# Altium schematic symbol library CUSTOM SCH - Copy.SchLib: 494 symbols (part 4 of 6) (continued)
## SMARC_2.0_CARRIER (continued)

## SMF15CT1G
designator D?
Manufacturer: ON Semiconductor; Manufacturer Part Number: SMF15CT1G; Number of Elements: 5; Capacitance: 33pF; Operating Supply Voltage: 15V; Max Surge Current: 5A; Reverse Breakdown Voltage: 17V; Direction: Unidirectional; Clamping Voltage: 29V; Peak Pulse Power: 100W; Power Line Protection: No; Max Breakdown Voltage: 19V; Leakage Current: 1uA; Element Configuration: Common Anode; ESD Protection: Yes; Test Current: 1mA; Supplier 1: Digi-Key; Stock 1: 2972; Pricing 1: 1=0.36, 10=0.289, 100=0.1971, 500=0.1478, 1000=0.1109 (USD); Case/Package: SC; Number of Pins: 6; Min Operating Temperature: -40°C; Max Operating Temperature: 125°C; Package Quantity: 1; Packaging: Tape and Reel; Number of Unidirectional Channels: 5; Reverse Standoff Voltage: 15V; Min Breakdown Voltage: 17V; Polarity: Unidirectional; Number of Channels: 5; Breakdown Voltage: 17V; Termination: SMD/SMT; Working Voltage: 15V; Power Dissipation: 100W; Max Reverse Leakage Current: 1uA; Peak Pulse Current: 5A; Voltage Rating (DC): 15V; Composition: Zener; Length: 2mm; Height: 1mm; Depth: 1.25mm; Width: 1.35mm; Radiation Hardening: No; Lead Free: Lead Free; ComponentLink1URL: http://www.onsemi.com/pub/Collateral/SMF05C-D.PDF?src-supplier=Digi-Key; ComponentLink1Description: http://www.onsemi.com/pub/Collateral/SMF05C-D.PDF?src-supplier=Digi-Key; ComponentLink2URL: http://www.onsemi.com/pub/Collateral/SMF05C-D.PDF?src-supplier=Avnet; ComponentLink2Description: http://www.onsemi.com/pub/Collateral/SMF05C-D.PDF?src-supplier=Avnet; ComponentLink3URL: http://www.onsemi.com/pub_link/Collateral/SMF05C-D.PDF?src-supplier=Future+Electronics; ComponentLink3Description: http://www.onsemi.com/pub_link/Collateral/SMF05C-D.PDF?src-supplier=Future+Electronics; Supplier Part Number 1: SMF15CT1GOSCT-ND
footprint SOT363-6
pins: 1 Cathode, 2 Anode, 3 Cathode, 4 Cathode, 5 Cathode, 6 Cathode

## SN74AHC14PWR
designator U?, comment Manufacturer Part Number: SN74AHC14PWR  (hidden comment: Part Number: SN74AHC14PWR)
IC INVERTER SCHMITT 6CH 14TSSOP; Manufacturer: Texas Instruments; Number of Inputs: 6; Propagation Delay: 10.6ns; Output Current: 25mA; Min Supply Voltage: 2V; Max Supply Voltage: 5.5V; Logic Function: Buffer,Inverter,Schmitt Trigger; Quiescent Current: 2uA; High Level Output Current: -8mA; Low Level Output Current: 8mA; Turn-On Delay Time: 12ns; Schmitt Trigger Input: Yes; Operating Supply Voltage: 5V; Supplier 1: Digi-Key; Stock 1: 20969; Pricing 1: 1=0.48, 10=0.364, 100=0.227, 500=0.1553, 1000=0.1195 (USD); Mount: Surface Mount; Case/Package: 14-TSSOP; Number of Pins: 14; Weight: 0.002018oz; Contact Plating: Tin,Matte; Min Operating Temperature: -40°C; Max Operating Temperature: 125°C; Package Quantity: 1; Packaging: Tape and Reel; Number of Elements: 6; Number of Circuits: 6; Number of Gates: 6; Number of Bits: 6; Length: 5mm; Height: 1.15mm; Width: 4.4mm; Radiation Hardening: No; REACH SVHC: No SVHC; Lead Free: Lead Free; ComponentLink1URL: http://www.ti.com/lit/ds/symlink/sn74ahc14.pdf?src-supplier=Digi-Key; ComponentLink1Description: http://www.ti.com/lit/ds/symlink/sn74ahc14.pdf?src-supplier=Digi-Key; ComponentLink2URL: http://www.farnell.com/datasheets/1962896.pdf?src-supplier=Element14; ComponentLink2Description: http://www.farnell.com/datasheets/1962896.pdf?src-supplier=Element14; ComponentLink3URL: http://www.ti.com/lit/gpn/sn74ahc14?src-supplier=Mouser; ComponentLink3Description: http://www.ti.com/lit/gpn/sn74ahc14?src-supplier=Mouser; ComponentLink4URL: http://www.ti.com/general/docs/lit/getliterature.tsp?genericPartNumber=SN54AHC14&&fileType=pdf&src-supplier=Avnet; ComponentLink4Description: http://www.ti.com/general/docs/lit/getliterature.tsp?genericPartNumber=SN54AHC14&&fileType=pdf&src-supplier=Avnet; ComponentLink5URL: http://focus.ti.com/lit/ds/symlink/sn74ahc14.pdf?src-supplier=Avnet; ComponentLink5Description: http://focus.ti.com/lit/ds/symlink/sn74ahc14.pdf?src-supplier=Avnet; ComponentLink6URL: http://www.farnell.com/datasheets/1633735.pdf?src-supplier=Element14; ComponentLink6Description: http://www.farnell.com/datasheets/1633735.pdf?src-supplier=Element14; ComponentLink7URL: https://www.verical.com/server-webapp/html/getDatasheet?partID=248985&src-supplier=Verical; ComponentLink7Description: https://www.verical.com/server-webapp/html/getDatasheet?partID=248985&src-supplier=Verical; ComponentLink8URL: http://www.ti.com/lit/ds/symlink/sn54ahc14.pdf?src-supplier=Avnet+Europe; ComponentLink8Description: http://www.ti.com/lit/ds/symlink/sn54ahc14.pdf?src-supplier=Avnet+Europe; ComponentLink9URL: http://www.jameco.com/Jameco/Products/ProdDS/1383795.pdf?src-supplier=Jameco; ComponentLink9Description: http://www.jameco.com/Jameco/Products/ProdDS/1383795.pdf?src-supplier=Jameco; ComponentLink10URL: http://www.produktinfo.conrad.com/datenblaetter/1000000-1099999/001016189-da-01-en-IC_HEX_SCHM_TR_SN74AHC14PWR_TSSOP_14_TID.pdf?src-supplier=Conrad; ComponentLink10Description: http://www.produktinfo.conrad.com/datenblaetter/1000000-1099999/001016189-da-01-en-IC_HEX_SCHM_TR_SN74AHC14PWR_TSSOP_14_TID.pdf?src-supplier=Conrad; Supplier Part Number 1: 296-1086-1-ND
footprint 14-TSSOP
pins: 1 1A, 2 1Y, 3 2A, 4 2Y, 7 GND (power), 14 VCC (power)

## SN74AUP1G34DRYR
designator U?
Manufacturer Part Number: SN74AUP1G34DRYR; Case/Package: USON-6L
footprint PSON50P145X100X60-6N
pins: 1 N.C. (io), 2 A (in), 3 GND (power), 4 Y (out), 5 N.C. (io), 6 VCC (power)

## SN74AUP1T34DCKR
designator U?
1-Bit Unidirectional Voltage-Level Translator 5-SC70 -40 to 85; Manufacturer Part Number: SN74AUP1T34DCKR; Case/Package: SOT23 5N
footprint SOT65P210X110-5N (SN74AUP1G34)
pins: 1 VCCA (power), 2 A (in), 3 GND (power), 4 B (out), 5 VCCB (power)

## SN74LVC1G80DCKR
designator U?
IC FF D-TYPE SNGL 1BIT SC70-5; Manufacturer: Texas Instruments; Clock Edge Trigger Type: Positive Edge; Max Supply Voltage: 5.5V; Min Supply Voltage: 1.65V; Propagation Delay: 5.2ns; Frequency: 160MHz; Output Current: 32mA; Logic Function: D-Type,Flip-Flop; Number of Elements: 1; Turn-On Delay Time: 1.1ns; High Level Output Current: -32mA; Polarity: Inverting; Supplier 1: Digi-Key; Stock 1: 59765; Pricing 1: 1=0.36, 10=0.29, 100=0.1978, 500=0.1483, 1000=0.1112 (USD); Mount: Surface Mount; Case/Package: SC70-5; Number of Pins: 5; Weight: 8.8E-05oz; Min Operating Temperature: -40°C; Max Operating Temperature: 125°C; Packaging: Tape and Reel; Package Quantity: 3000; Number of Bits per Element: 1; Low Level Output Current: 32mA; Number of Circuits: 1; Number of Input Lines: 1; Number of Output Lines: 1; Number of Bits: 1; Max Frequency: 160MHz; Termination: SMD/SMT; Number of Gates: 1; Length: 2mm; Height: 0.9mm; Width: 1.25mm; Radiation Hardening: No; REACH SVHC: No SVHC; Lead Free: Lead Free; ComponentLink1URL: http://focus.ti.com/lit/ds/symlink/sn74lvc1g80.pdf?src-supplier=Avnet+Europe; ComponentLink1Description: http://focus.ti.com/lit/ds/symlink/sn74lvc1g80.pdf?src-supplier=Avnet+Europe; ComponentLink2URL: https://www.verical.com/server-webapp/html/getDatasheet?partID=189864&src-supplier=Verical; ComponentLink2Description: https://www.verical.com/server-webapp/html/getDatasheet?partID=189864&src-supplier=Verical; ComponentLink3URL: http://www.ti.com/lit/ds/symlink/sn74lvc1g80.pdf?src-supplier=Digi-Key; ComponentLink3Description: http://www.ti.com/lit/ds/symlink/sn74lvc1g80.pdf?src-supplier=Digi-Key; ComponentLink4URL: http://www.ti.com/general/docs/lit/getliterature.tsp?genericPartNumber=SN74LVC1G80&&fileType=pdf&src-supplier=Avnet; ComponentLink4Description: http://www.ti.com/general/docs/lit/getliterature.tsp?genericPartNumber=SN74LVC1G80&&fileType=pdf&src-supplier=Avnet; ComponentLink5URL: http://www.farnell.com/datasheets/1831218.pdf?src-supplier=Element14; ComponentLink5Description: http://www.farnell.com/datasheets/1831218.pdf?src-supplier=Element14; ComponentLink6URL: http://www.farnell.com/datasheets/1882705.pdf?src-supplier=Element14; ComponentLink6Description: http://www.farnell.com/datasheets/1882705.pdf?src-supplier=Element14; Supplier Part Number 1: 296-9852-6-ND; Manufacturer Part Number: SN74LVC1G80DCKR
footprint SC70-5
pins: 1 D (in), 2 CLK (in), 3 GND (power), 4 Q (out), 5 VCC (power)

## SN74LVC2G74DCUR
designator U?  Manufacturer Part Number: SN74LVC2G74DCUR
IC FF D-TYPE SNGL 1BIT US8; Manufacturer: Texas Instruments; Clock Edge Trigger Type: Positive Edge; Max Supply Voltage: 5.5V; Min Supply Voltage: 1.65V; Propagation Delay: 14.4ns; Frequency: 200MHz; Output Current: 32mA; Number of Elements: 1; Logic Function: AND,D-Type; Turn-On Delay Time: 4.1ns; High Level Output Current: -32mA; Polarity: Non-Inverting; Number of Gates: 2; Quiescent Current: 10uA; Supplier 1: Digi-Key; Stock 1: 34576; Pricing 1: 1=0.55, 10=0.467, 100=0.349, 500=0.2742, 1000=0.2119 (USD); Mount: Surface Mount; Case/Package: VSSOP; Number of Pins: 8; Weight: 0.000339oz; Contact Plating: Gold; Min Operating Temperature: -40°C; Max Operating Temperature: 125°C; Packaging: Tape and Reel; Package Quantity: 3000; Number of Bits per Element: 1; Low Level Output Current: 32mA; Number of Circuits: 1; Number of Input Lines: 1; Number of Output Lines: 1; Number of Bits: 1; Max Frequency: 200MHz; Termination: SMD/SMT; Number of Channels: 1; Length: 2.3mm; Height: 0.85mm; Width: 2mm; Radiation Hardening: No; REACH SVHC: No SVHC; Lead Free: Lead Free; ComponentLink1URL: https://www.verical.com/server-webapp/html/getDatasheet?partID=189863&src-supplier=Verical; ComponentLink1Description: https://www.verical.com/server-webapp/html/getDatasheet?partID=189863&src-supplier=Verical; ComponentLink2URL: http://www.ti.com/lit/ds/symlink/sn74lvc2g74.pdf?src-supplier=Digi-Key; ComponentLink2Description: http://www.ti.com/lit/ds/symlink/sn74lvc2g74.pdf?src-supplier=Digi-Key; ComponentLink3URL: http://www.farnell.com/datasheets/1849776.pdf?src-supplier=Element14; ComponentLink3Description: http://www.farnell.com/datasheets/1849776.pdf?src-supplier=Element14; ComponentLink4URL: http://focus.ti.com/lit/ds/symlink/sn74lvc2g74.pdf?src-supplier=Avnet+Europe; ComponentLink4Description: http://focus.ti.com/lit/ds/symlink/sn74lvc2g74.pdf?src-supplier=Avnet+Europe; ComponentLink5URL: http://www.ti.com/general/docs/lit/getliterature.tsp?genericPartNumber=SN74LVC2G74&amp;&amp;fileType=pdf&src-supplier=Avnet+Asia; ComponentLink5Description: http://www.ti.com/general/docs/lit/getliterature.tsp?genericPartNumber=SN74LVC2G74&amp;&amp;fileType=pdf&src-supplier=Avnet+Asia; ComponentLink6URL: http://www.jameco.com/Jameco/Products/ProdDS/757249.pdf?src-supplier=Jameco; ComponentLink6Description: http://www.jameco.com/Jameco/Products/ProdDS/757249.pdf?src-supplier=Jameco; ComponentLink7URL: http://www.ti.com/general/docs/lit/getliterature.tsp?genericPartNumber=SN74LVC2G74&&fileType=pdf&src-supplier=Avnet; ComponentLink7Description: http://www.ti.com/general/docs/lit/getliterature.tsp?genericPartNumber=SN74LVC2G74&&fileType=pdf&src-supplier=Avnet; ComponentLink8URL: http://www.produktinfo.conrad.com/datenblaetter/1000000-1099999/001074282-da-01-en-IC_D_TYPE_POS_T_SN74LVC2G74DCUR_US_8_TID.pdf?src-supplier=Conrad; ComponentLink8Description: http://www.produktinfo.conrad.com/datenblaetter/1000000-1099999/001074282-da-01-en-IC_D_TYPE_POS_T_SN74LVC2G74DCUR_US_8_TID.pdf?src-supplier=Conrad; ComponentLink9URL: http://datasheet.iiic.cc/texas_instruments/SN74LVC2G74DCUR.pdf?src-supplier=IIIC; ComponentLink9Description: http://datasheet.iiic.cc/texas_instruments/SN74LVC2G74DCUR.pdf?src-supplier=IIIC; Supplier Part Number 1: 296-12755-1-ND
footprint DCU8-M
pins: 1 CLK (in), 2 D (in), 3 Q (out), 4 GND (power), 5 Q (out), 6 CLR (in), 7 PRE (in), 8 VCC (power)

## SP3485EN-L/TR
designator U?  Manufacturer Part Number: SP3485EN-L/TR  Case/Package: 8-SOIC
SP3485 Series 10 Mbps 3.3 V Low Power Half Duplex RS-485 Transceiver - SOIC-8N; Manufacturer: MaxLinear; Data Rate: 10Mbps; Receiver Hysteresis: 20mV; Supplier 1: Digi-Key; RoHS: No; Stock 1: 20475; Pricing 1: 1=2.15000, 10=1.92700, 25=1.81800, 100=1.45440, 250=1.27260, 500=1.23624, 1000=0.98172 (USD); Mount: Surface Mount; Number of Pins: 8; Min Operating Temperature: -40°C; Max Operating Temperature: 85°C; Packaging: Cut Tape; Simplex/Duplex: Half Duplex; ComponentLink1URL: https://www.exar.com/content/document.ashx?id=639&src-supplier=Digi-Key; ComponentLink1Description: https://www.exar.com/content/document.ashx?id=639&src-supplier=Digi-Key; Supplier Part Number 1: 1016-1817-1-ND
footprint 8-SOIC
pins: 1 RO, 2 RE, 3 DE, 4 DI, 5 GND, 6 A, 7 B, 8 VCC
text: .

## SPH0645LM4H-B
designator U?
Manufacturer Part Number: *; Case/Package: *
pins: 1 WS, 2 SEL, 3 GND, 4 BCLK, 5 VDD, 6 DATA

## SPI FLASH (W25Q16JVSNIQ)
designator U?  Manufacturer Part Number: W25Q16JVSNIQ  (hidden comment: *)
FLASH - NOR Memory IC 16Mb (2M x 8) SPI - Quad I/O 133MHz  8-SOIC; Manufacturer: Winbond; Interface: SPI,Serial; Page Size: 256B; Access Time: 6ns; Min Supply Voltage: 2.7V; Max Supply Voltage: 3.6V; Supplier 1: Digi-Key; Stock 1: 64142; Pricing 1: 1=0.49, 10=0.484, 25=0.4492, 50=0.4468, 100=0.397, 250=0.3918, 500=0.3859, 1000=0.3756, 5000=0.3376 (USD); Mount: Surface Mount; Case/Package: 8-SOIC; Number of Pins: 8; Min Operating Temperature: -40°C; Max Operating Temperature: 85°C; Memory Type: NOR; Packaging: Rail/Tube; Memory Size: 16Mb; Frequency: 133MHz; ComponentLink1URL: http://www.winbond.com/resource-files/w25q16jv%20spi%20revg%2003222018%20plus.pdf?src-supplier=Digi-Key; ComponentLink1Description: http://www.winbond.com/resource-files/w25q16jv%20spi%20revg%2003222018%20plus.pdf?src-supplier=Digi-Key; Supplier Part Number 1: W25Q16JVSNIQ-ND
footprint 8-SOIC
pins: 1 CS, 2 SO, 3 WP, 4 GND, 5 SI, 6 SCK, 7 RESET, 8 VCC

## SPI_FLASH_WSON8
designator U?  Manufacturer Part Number: GD25LQ255E  Case/Package: WSON8
SPI NOR FLASH 256Mbit
pins: 1 ~{CS}, 2 DO(D1), 3 ~{WP}(D2), 4 VSS, 5 DI(D0), 6 CLK, 7 ~{HOLD}(D3), 8 VCC, 9 EPAD

## SS1H10
designator D?
Diode Schottky 100V 1A SMA Vishay SS1H10-E3/61T; Manufacturer Part Number: SS1H10-E3/61T; Case/Package: DO-214AC
footprint DIOM5127X229N
pins: 1 K, 2 A

## SS14D0839VG5PA
designator S?
Top knob Slide Switches; Manufacturer Part Number: SS14D0839VG5PA; Value: SP4T; Case/Package: TH
footprint SS14D0839VG5PA
pins: 1, 2, 3, 4, 5, MH1, MH2

## SS24-E3_5BT
designator D?
Diode; Manufacturer_Name: Vishay; Manufacturer_Part_Number: SS24-E3/5BT; Datasheet Link: http://www.vishay.com/docs/88748/ss22.pdf; Height: 2.44mm; Mouser Part Number: 625-SS24-E3/5BT; Mouser Price/Stock: https://www.mouser.co.uk/ProductDetail/Vishay-General-Semiconductor/SS24-E3-5BT?qs=x2jpVgRnAtPao%2FlgT1qL5A%3D%3D; Arrow Part Number: SS24-E3/5BT; Arrow Price/Stock: https://www.arrow.com/en/products/ss24-e35bt/vishay
footprint DIOM5436X244N
pins: 1 K, 2 A

## SS28
designator D?
80V 850mV 2A 2A SMA(DO-214AC) Schottky Barrier Diodes (SBD) ROHS; Manufacturer_Part_Number: SS28; Case/Package: DO-214AC
footprint DO-214AC (SMA(DO-214AC))
pins: A, K

## SS34
designator D?  Manufacturer Part Number: SS34
40V 3A 550mV @ 3A SMA Schottky Barrier Diodes (SBD) RoHS; Value: SS34; Case/Package: SMA; ComponentLink1URL: https://datasheet.ciiva.com/30478/0900766b812769b5-30478676.pdf?src-supplier=RSComponents; ComponentLink1Description: https://datasheet.ciiva.com/30478/0900766b812769b5-30478676.pdf?src-supplier=RSComponents; ComponentLink2URL: https://datasheet.ciiva.com/25958/esd9x3-3st5g-d-25958458.pdf?src-supplier=Avnet+Europe; ComponentLink2Description: https://datasheet.ciiva.com/25958/esd9x3-3st5g-d-25958458.pdf?src-supplier=Avnet+Europe; ComponentLink3URL: https://datasheet.ciiva.com/1219/1748783-1219324.pdf?src-supplier=Newark; ComponentLink3Description: https://datasheet.ciiva.com/1219/1748783-1219324.pdf?src-supplier=Newark; ComponentLink4URL: https://datasheet.ciiva.com/3304/esd9x3-3st5g-d-3304012.pdf?src-supplier=Avnet; ComponentLink4Description: https://datasheet.ciiva.com/3304/esd9x3-3st5g-d-3304012.pdf?src-supplier=Avnet; ComponentLink5URL: https://datasheet.ciiva.com/339/esd9x3-3st5g-d-339709.pdf?src-supplier=Digi-Key; ComponentLink5Description: https://datasheet.ciiva.com/339/esd9x3-3st5g-d-339709.pdf?src-supplier=Digi-Key; ComponentLink6URL: https://datasheet.ciiva.com/16215/esd9x3-3st5g-d-16215149.pdf?src-supplier=Future+Electronics; ComponentLink6Description: https://datasheet.ciiva.com/16215/esd9x3-3st5g-d-16215149.pdf?src-supplier=Future+Electronics; ComponentLink7URL: https://datasheet.ciiva.com/339/esd9x3-3st5g-d-339710.pdf?src-supplier=Digi-Key; ComponentLink7Description: https://datasheet.ciiva.com/339/esd9x3-3st5g-d-339710.pdf?src-supplier=Digi-Key; ComponentLink8URL: https://datasheet.ciiva.com/339/esd9x3-3st5g-d-339711.pdf?src-supplier=Digi-Key; ComponentLink8Description: https://datasheet.ciiva.com/339/esd9x3-3st5g-d-339711.pdf?src-supplier=Digi-Key
footprint SMA
pins: A, K

## SS310L
designator D?
Rectifier Diode Schottky 100V 3A Automotive 2-Pin SOD-123W T/R; Manufacturer_Part_Number: SS310LWHRVG; Case/Package: DO-214AC
footprint DO-214AC(SMA)
pins: 1, 2

## SS8050-G
designator Q?
Bipolar Transistors - BJT NPN TRANSISTOR 1.5A 40V; Manufacturer_Name: Comchip Technology; Geometry.Height: 1.15mm; Manufacturer_Part_Number: SS8050-G; RS Part Number: *; RS Price/Stock: *; Mouser Part Number: 750-SS8050-G; Mouser Price/Stock: https://www.mouser.com/Search/Refine.aspx?Keyword=750-SS8050-G; Datasheet Link: http://www.comchiptech.com/admin/files/product/SS8050-G%20RevA181526.pdf
footprint SOT95P240X115-3N
pins: 1 B, 2 E, 3 C

## SS8050-G_1
designator Q?, comment SS8050-G
Bipolar Transistors - BJT NPN TRANSISTOR 1.5A 40V; Manufacturer_Name: Comchip Technology; Geometry.Height: 1.15mm; Manufacturer_Part_Number: SS8050-G; RS Part Number: *; RS Price/Stock: *; Mouser Part Number: 750-SS8050-G; Mouser Price/Stock: https://www.mouser.com/Search/Refine.aspx?Keyword=750-SS8050-G; Datasheet Link: http://www.comchiptech.com/admin/files/product/SS8050-G%20RevA181526.pdf
footprint SOT95P240X115-3N
pins: 1 B, 2 E, 3 C

## ST1S12GR
designator U?
IC REG BUCK ADJ 700mA TSOT23-5; Manufacturer: STMicroelectronics; Number of Outputs: 1; Min Input Voltage: 2.5V; Max Input Voltage: 5.5V; Output Voltage: 1.2V; Efficiency: 90%; Switching Frequency: 1.7MHz; Synchronous Rectifier: Yes; Min Output Voltage: 600mV; Max Output Voltage: 5V; Output Type: Adjustable; Supplier 1: Mouser; Stock 1: 200; Pricing 1: 1=1.02, 10=0.871, 50=0.871, 100=0.669, 1000=0.467, 10000=0.399 (USD); Mount: Surface Mount; Case/Package: SOT-23-5; Number of Pins: 5; Min Operating Temperature: -40°C; Max Operating Temperature: 125°C; Operating Supply Voltage: 5.5V; Output Current: 700mA; Packaging: Tape and Reel; Package Quantity: 1; Max Output Current: 700mA; Radiation Hardening: No; REACH SVHC: No SVHC; Lead Free: Lead Free; ComponentLink1URL: http://www.st.com/st-web-ui/static/active/en/resource/technical/document/datasheet/CD00181873.pdf?src-supplier=Future+Electronics; ComponentLink1Description: http://www.st.com/st-web-ui/static/active/en/resource/technical/document/datasheet/CD00181873.pdf?src-supplier=Future+Electronics; ComponentLink2URL: https://www.verical.com/server-webapp/html/getDatasheet?partID=164460&src-supplier=Verical; ComponentLink2Description: https://www.verical.com/server-webapp/html/getDatasheet?partID=164460&src-supplier=Verical; ComponentLink3URL: http://www.st.com/web/en/resource/technical/document/datasheet/CD00181873.pdf?src-supplier=Avnet+Europe; ComponentLink3Description: http://www.st.com/web/en/resource/technical/document/datasheet/CD00181873.pdf?src-supplier=Avnet+Europe; ComponentLink4URL: http://www.st.com/content/ccc/resource/technical/document/datasheet/22/99/6c/42/0d/cc/47/8f/CD00181873.pdf/files/CD00181873.pdf/jcr:content/translations/en.CD00181873.pdf?src-supplier=Digi-Key; ComponentLink4Description: http://www.st.com/content/ccc/resource/technical/document/datasheet/22/99/6c/42/0d/cc/47/8f/CD00181873.pdf/files/CD00181873.pdf/jcr:content/translations/en.CD00181873.pdf?src-supplier=Digi-Key; ComponentLink5URL: http://www.produktinfo.conrad.com/datenblaetter/1100000-1199999/001185701-da-01-en-IC_REG_BUCK_SYNC_A_ST1S12GR_SOT_23_5_STM.pdf?src-supplier=Conrad; ComponentLink5Description: http://www.produktinfo.conrad.com/datenblaetter/1100000-1199999/001185701-da-01-en-IC_REG_BUCK_SYNC_A_ST1S12GR_SOT_23_5_STM.pdf?src-supplier=Conrad; Supplier Part Number 1: 511-ST1S12GR; Manufacturer Part Number: ST1S12GR
footprint SOT23-5
pins: 1 EN, 2 GND, 3 SW, 4 Vin, 5 FB

## ST1S12GR_1
designator U?, comment ST1S12GR
IC REG BUCK ADJ 700mA TSOT23-5; Manufacturer: STMicroelectronics; Number of Outputs: 1; Min Input Voltage: 2.5V; Max Input Voltage: 5.5V; Output Voltage: 1.2V; Efficiency: 90%; Switching Frequency: 1.7MHz; Synchronous Rectifier: Yes; Min Output Voltage: 600mV; Max Output Voltage: 5V; Output Type: Adjustable; Supplier 1: Mouser; Stock 1: 200; Pricing 1: 1=1.02, 10=0.871, 50=0.871, 100=0.669, 1000=0.467, 10000=0.399 (USD); Mount: Surface Mount; Case/Package: SOT-23-5; Number of Pins: 5; Min Operating Temperature: -40°C; Max Operating Temperature: 125°C; Operating Supply Voltage: 5.5V; Output Current: 700mA; Packaging: Tape and Reel; Package Quantity: 1; Max Output Current: 700mA; Radiation Hardening: No; REACH SVHC: No SVHC; Lead Free: Lead Free; ComponentLink1URL: http://www.st.com/st-web-ui/static/active/en/resource/technical/document/datasheet/CD00181873.pdf?src-supplier=Future+Electronics; ComponentLink1Description: http://www.st.com/st-web-ui/static/active/en/resource/technical/document/datasheet/CD00181873.pdf?src-supplier=Future+Electronics; ComponentLink2URL: https://www.verical.com/server-webapp/html/getDatasheet?partID=164460&src-supplier=Verical; ComponentLink2Description: https://www.verical.com/server-webapp/html/getDatasheet?partID=164460&src-supplier=Verical; ComponentLink3URL: http://www.st.com/web/en/resource/technical/document/datasheet/CD00181873.pdf?src-supplier=Avnet+Europe; ComponentLink3Description: http://www.st.com/web/en/resource/technical/document/datasheet/CD00181873.pdf?src-supplier=Avnet+Europe; ComponentLink4URL: http://www.st.com/content/ccc/resource/technical/document/datasheet/22/99/6c/42/0d/cc/47/8f/CD00181873.pdf/files/CD00181873.pdf/jcr:content/translations/en.CD00181873.pdf?src-supplier=Digi-Key; ComponentLink4Description: http://www.st.com/content/ccc/resource/technical/document/datasheet/22/99/6c/42/0d/cc/47/8f/CD00181873.pdf/files/CD00181873.pdf/jcr:content/translations/en.CD00181873.pdf?src-supplier=Digi-Key; ComponentLink5URL: http://www.produktinfo.conrad.com/datenblaetter/1100000-1199999/001185701-da-01-en-IC_REG_BUCK_SYNC_A_ST1S12GR_SOT_23_5_STM.pdf?src-supplier=Conrad; ComponentLink5Description: http://www.produktinfo.conrad.com/datenblaetter/1100000-1199999/001185701-da-01-en-IC_REG_BUCK_SYNC_A_ST1S12GR_SOT_23_5_STM.pdf?src-supplier=Conrad; Supplier Part Number 1: 511-ST1S12GR; Manufacturer Part Number: ST1S12GR
footprint SOT23-5
pins: 1 EN, 2 GND, 3 SW, 4 Vin, 5 FB

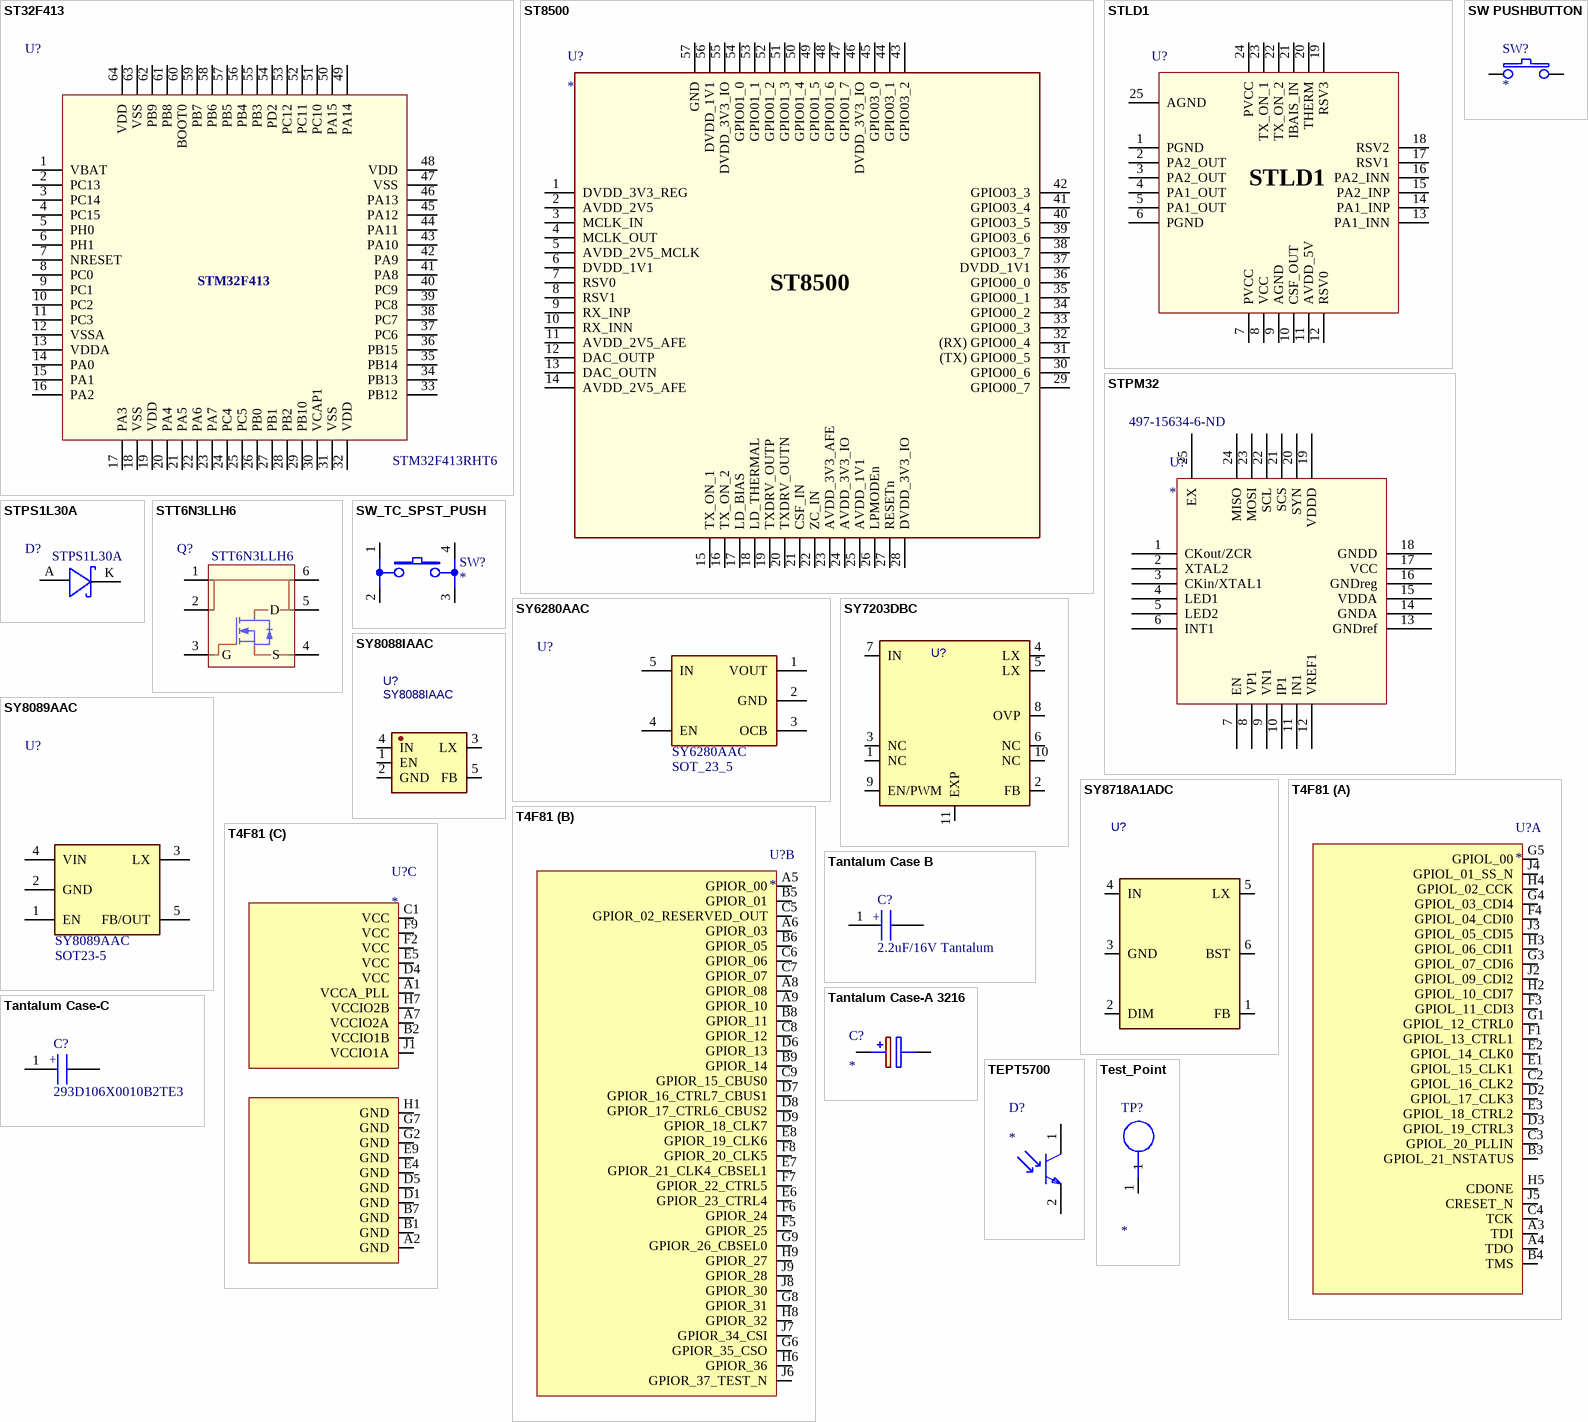
[diagram p40: symbols ST32F413 to Test_Point]

## ST32F413
designator U?  Manufacturer Part Number 1: STM32F413RHT6
MCU 32-bit ARM Cortex M4 RISC 1.5MB Flash 3.3V 64-Pin LQFP Tray; Manufacturer 1: STMicroelectronics; Supplier 1: Digi-Key; RoHS: No; Category: Microcontrollers; Stock 1: 60; Pricing 1: 1=9.27000, 10=8.37100, 25=7.98160, 100=6.93030, 250=6.61880, 500=6.03478, 1000=5.25609 (USD); Supplier Part Number 1: 497-17012-ND
pins: 1 VBAT, 2 PC13, 3 PC14, 4 PC15, 5 PH0, 6 PH1, 7 NRESET, 8 PC0, 9 PC1, 10 PC2, 11 PC3, 12 VSSA, 13 VDDA, 14 PA0, 15 PA1, 16 PA2, 17 PA3, 18 VSS, 19 VDD, 20 PA4, 21 PA5, 22 PA6, 23 PA7, 24 PC4, 25 PC5, 26 PB0, 27 PB1, 28 PB2, 29 PB10, 30 VCAP1, 31 VSS, 32 VDD, 33 PB12, 34 PB13, 35 PB14, 36 PB15, 37 PC6, 38 PC7, 39 PC8, 40 PC9, 41 PA8, 42 PA9, 43 PA10, 44 PA11, 45 PA12, 46 PA13, 47 VSS, 48 VDD, 49 PA14, 50 PA15, 51 PC10, 52 PC11, 53 PC12, 54 PD2, 55 PB3, 56 PB4, 57 PB5, 58 PB6, 59 PB7, 60 BOOT0, 61 PB8, 62 PB9, 63 VSS, 64 VDD
text: STM32F413

## ST8500
designator U?
Telecom IC Power Line Communication Modem (PLC) 56-QFN (7x7); Manufacturer: STMicroelectronics; Manufacturer Part Number: ST8500; Interface: I2C,SPI,UART,USART; Number of Circuits: 1; Supplier 1: Mouser; Stock 1: 0; Pricing 1: 1=9.5, 10=8.58, 25=8.18, 50=8.18, 100=7.11, 250=6.79, 500=6.19, 1000=5.39, 2500=5.19, 5000=4.79, 10000=5.39 (USD); Mount: Surface Mount; Case/Package: QFN56 (7X7); Min Operating Temperature: -40°C; Max Operating Temperature: 105°C; ComponentLink1URL: https://www.st.com/resource/en/datasheet/st8500.pdf?src-supplier=Digi-Key; ComponentLink1Description: https://www.st.com/resource/en/datasheet/st8500.pdf?src-supplier=Digi-Key; Supplier Part Number 1: 511-ST8500
footprint QFN56-7x7mm
pins: 1 DVDD_3V3_REG, 2 AVDD_2V5, 3 MCLK_IN, 4 MCLK_OUT, 5 AVDD_2V5_MCLK, 6 DVDD_1V1, 7 RSV0, 8 RSV1, 9 RX_INP, 10 RX_INN, 11 AVDD_2V5_AFE, 12 DAC_OUTP, 13 DAC_OUTN, 14 AVDD_2V5_AFE, 15 TX_ON_1, 16 TX_ON_2, 17 LD_BIAS, 18 LD_THERMAL, 19 TXDRV_OUTP, 20 TXDRV_OUTN, 21 CSF_IN, 22 ZC_IN, 23 AVDD_3V3_AFE, 24 AVDD_3V3_IO, 25 AVDD_1V1, 26 LPMODEn, 27 RESETn, 28 DVDD_3V3_IO, 29 GPIO00_7, 30 GPIO00_6, 31 (TX) GPIO00_5, 32 (RX) GPIO00_4, 33 GPIO00_3, 34 GPIO00_2, 35 GPIO00_1, 36 GPIO00_0, 37 DVDD_1V1, 38 GPIO03_7, 39 GPIO03_6, 40 GPIO03_5, 41 GPIO03_4, 42 GPIO03_3, 43 GPIO03_2, 44 GPIO03_1, 45 GPIO03_0, 46 DVDD_3V3_IO, 47 GPIO01_7, 48 GPIO01_6, 49 GPIO01_5, 50 GPIO01_4, 51 GPIO01_3, 52 GPIO01_2, 53 GPIO01_1, 54 GPIO01_0, 55 DVDD_3V3_IO, 56 DVDD_1V1, 57 GND

## STLD1
designator U?  (value not drawn)
LIN Transceivers IND. & POWER CONV.; Manufacturer: STMicroelectronics; Operating Supply Current: 560uA; Supplier 1: Mouser; Manufacturer Part Number: STLD1; Stock 1: 0; Pricing 1: 1=5.25, 10=4.46, 50=4.46, 100=3.87, 250=3.67, 500=3.29, 1000=2.78, 2500=2.64, 5000=2.54, 10000=2.38 (USD); Mount: Surface Mount; Case/Package: QFN24 4X4; Min Operating Temperature: -40°C; Max Operating Temperature: 105°C; Packaging: Tray; Supplier Part Number 1: 511-STLD1
footprint QFN24-4x4MM (QFN24L (4x4x1) 0.5 pitch_STPM32)
pins: 1 PGND, 2 PA2_OUT, 3 PA2_OUT, 4 PA1_OUT, 5 PA1_OUT, 6 PGND, 7 PVCC, 8 VCC, 9 AGND, 10 CSF_OUT, 11 AVDD_5V, 12 RSV0, 13 PA1_INN, 14 PA1_INP, 15 PA2_INP, 16 PA2_INN, 17 RSV1, 18 RSV2, 19 RSV3, 20 THERM, 21 IBAIS_IN, 22 TX_ON_2, 23 TX_ON_1, 24 PVCC, 25 AGND